# Altium footprint library xialeste-20221201.PcbLib: 195 footprints (part 6 of 13)
Each footprint in its own frame and in the unit in brackets; x right, y up, seen from the top. Pads: shape width x height; smd on the part's side, far side on the other; paste and mask are expansions set on the pad; w line width, h text height; cw(c..) or ccw(c..) is an arc to the next point about the centre after c.
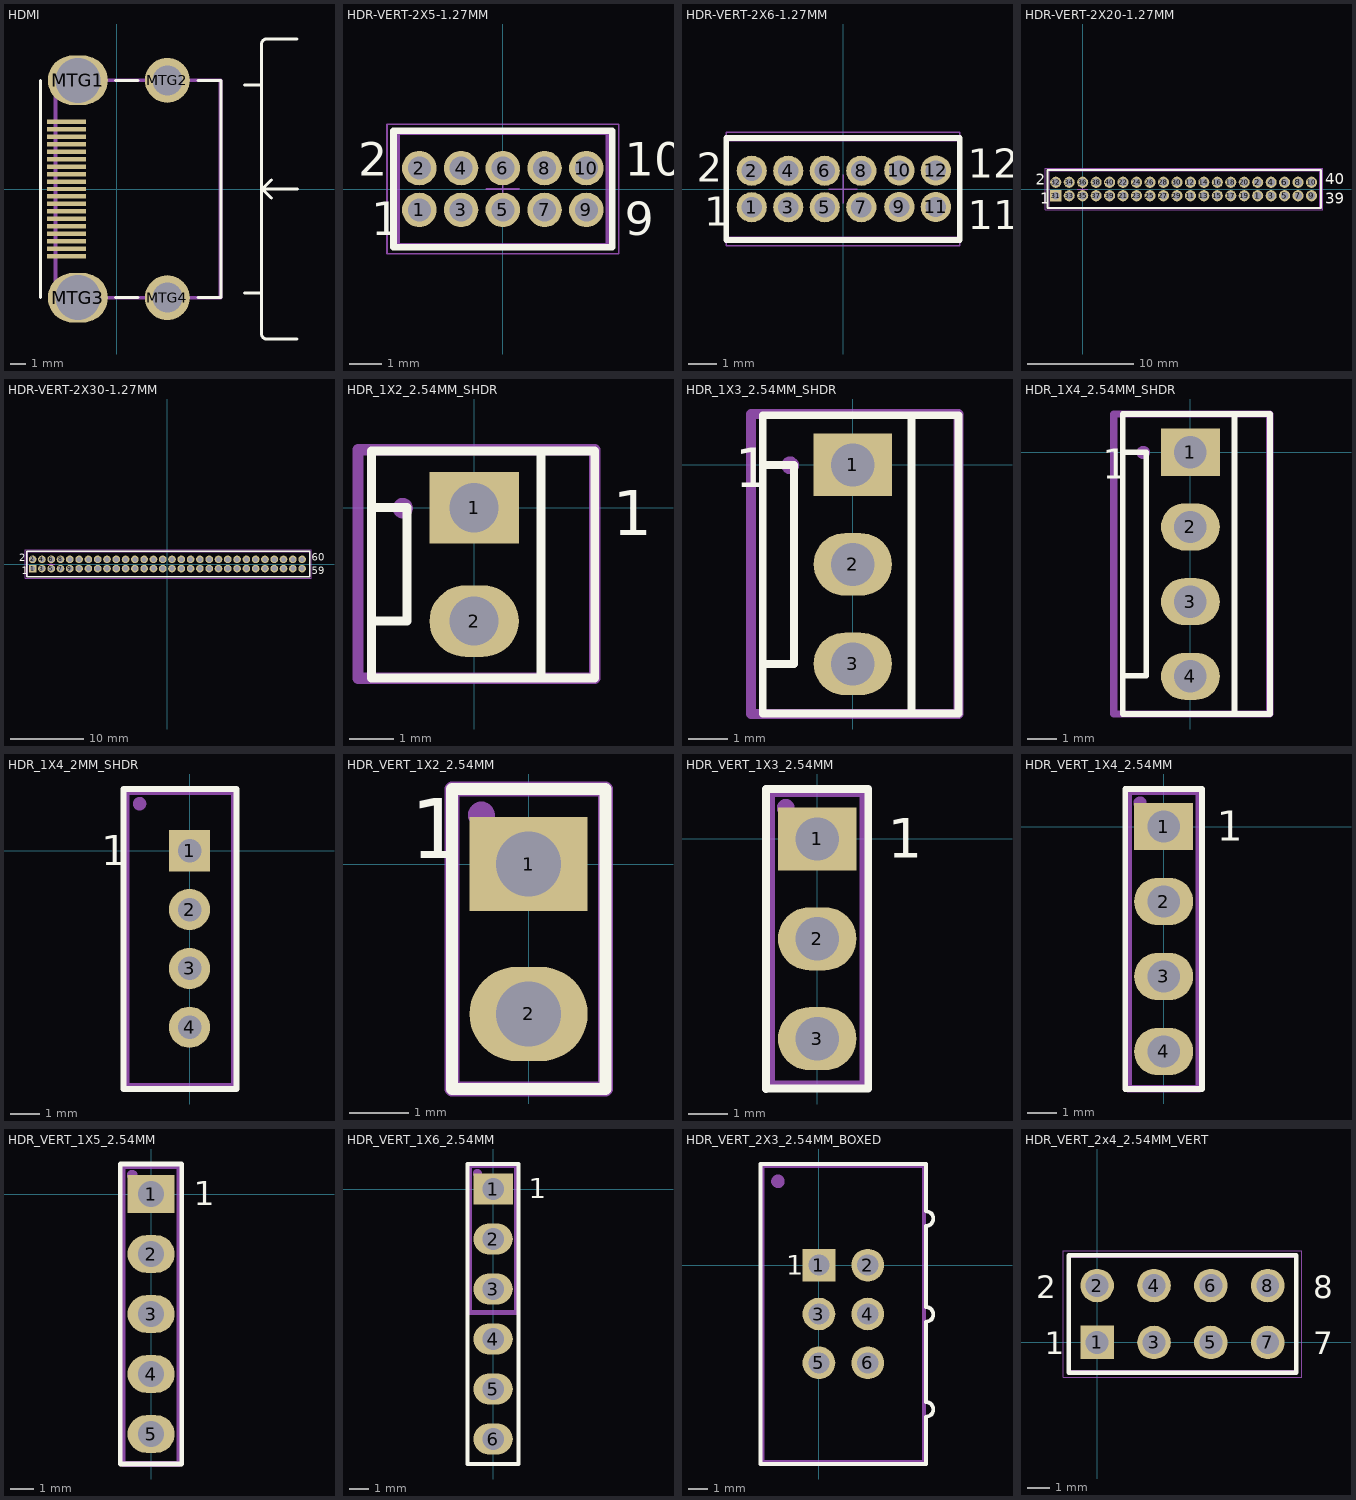
[diagram p5: the footprints below, top view; thin cyan lines are the x and y axes]

## HDMI [mm]
pads (23):
  rect 2.6x0.3 smd mask+0.025: 1(-3.36,4.5) 2(-3.36,4) 3(-3.36,3.5) 4(-3.36,3) 5(-3.36,2.5) 6(-3.36,2) 7(-3.36,1.5) 8(-3.36,1) 9(-3.36,0.5) 10(-3.36,0) 11(-3.36,-0.5) 12(-3.36,-1) 13(-3.36,-1.5) 14(-3.36,-2) 15(-3.36,-2.5) 16(-3.36,-3) 17(-3.36,-3.5) 18(-3.36,-4) 19(-3.36,-4.5)
  oval 4x3.3 hole 3: MTG1(-2.6,7.25) MTG3(-2.6,-7.25)
  round 3 hole 2: MTG2(3.36,7.25) MTG4(3.36,-7.25)
Top Overlay:
  lines w0.2: -5.1,-7.25 -5.1,7.25 ; -0.1,-7.25 1.4,-7.25 ; -0.1,7.25 1.4,7.25 ; 5.4,-7.25 6.9,-7.25 6.95,-7.2 6.95,7.25 ; 5.4,7.25 6.9,7.25 ; 8.5,-6.95 9.65,-6.95 ; 8.5,6.95 9.65,6.95 ; 9.95,10 12,10 ; 10,10 ccw(c9.975,9.675) 9.65,9.7 9.65,-9.7 ccw(c9.975,-9.675) 10,-10 12,-10 ; 10.3,-0.6 9.7,0 ; 10.3,0.6 9.7,0 ; 12.05,0 9.7,0
Mechanical 1:
  text "plastic may go over the board edge" at -6.6,9.6 h0.5
  text "doesnt fit on one place. Bottom" at -6.5,10.8 h0.5
  text "NOTE: Holes are big and connector" at -6.5,12 h0.5
Mechanical 29:
  lines w0.254: -4.1,-7.25 6.9,-7.25 6.9,7.25 -4.1,7.25 -4.1,-7.25
  text ".Designator" at 0.5,2.3 h1.52
3D body "HDMI connector.STEP": height 6.23, standoff -2.15, extent -4.53,-7.5 7.62,7.5

## HDR-VERT-2X5-1.27MM [mm] "Pin Header, pitch 1.27 mm, THT, Vertical, dual row, 10p"
height 5.65
pads (10):
  round 1.05 hole 0.7: 1(-2.54,-0.635) 2(-2.54,0.635) 3(-1.27,-0.635) 4(-1.27,0.635) 5(0,-0.635) 6(0,0.635) 7(1.27,-0.635) 8(1.27,0.635) 9(2.54,-0.635) 10(2.54,0.635)
Top Overlay:
  lines w0.2: -3.325,-1.775 -3.325,1.775 3.325,1.775 3.325,-1.775 -3.325,-1.775
  text "9" at 3.705,-1.4 h1.02
  text "10" at 3.705,0.4 h1.02
  text "1" at -4.005,-1.4 h1.02
  text "2" at -4.405,0.4 h1.02
Mechanical 13:
  lines w0.1: -3.175,-1.7 -3.175,1.7 3.175,1.7 3.175,-1.7 -3.175,-1.7
Mechanical 15:
  lines w0.05: -0.5,0 0.5,0 ; 0,-0.5 0,0.5 ; -3.525,-1.975 -3.525,1.975 3.525,1.975 3.525,-1.975 -3.525,-1.975
3D body "62201021121.stp": height 5.33, standoff -2.27, extent -3.175,-1.7 3.175,1.7

## HDR-VERT-2X6-1.27MM [mm] "Pin Header, pitch 1.27 mm, THT, Vertical, dual row, 12p"
height 5.65
pads (12):
  round 1.05 hole 0.7: 1(-3.175,-0.635) 2(-3.175,0.635) 3(-1.905,-0.635) 4(-1.905,0.635) 5(-0.635,-0.635) 6(-0.635,0.635) 7(0.635,-0.635) 8(0.635,0.635) 9(1.957,-0.622) 10(1.957,0.648) 11(3.227,-0.622) 12(3.227,0.648)
Top Overlay:
  lines w0.2: -4.064,-1.775 -4.064,1.775 4.064,1.775 4.064,-1.775 -4.064,-1.775
  text "11" at 4.34,-1.4 h1.02
  text "12" at 4.34,0.4 h1.02
  text "1" at -4.826,-1.27 h1.02
  text "2" at -5.08,0.254 h1.02
Mechanical 13:
  lines w0.1: -4.064,-1.7 -4.064,1.7 4.064,1.7 4.064,-1.7 -4.064,-1.7
Mechanical 15:
  lines w0.05: -0.5,0 0.5,0 ; 0,-0.5 0,0.5 ; -4.064,-1.975 -4.064,1.975 4.064,1.975 4.064,-1.975 -4.064,-1.975
3D body "Pin header 2x06 TH pitch 1.27mm.stp": height 6.09, standoff -1.51, extent -3.81,-1.7 3.81,1.7

## HDR-VERT-2X20-1.27MM [mm] "Pin Header, pitch 1.27 mm, THT, Vertical, dual row, 40p"
height 5.65
pads (40):
  round 1.05 hole 0.7: 1(16.51,-0.635) 2(16.51,0.635) 3(17.78,-0.635) 4(17.78,0.635) 5(19.05,-0.635) 6(19.05,0.635) 7(20.32,-0.635) 8(20.32,0.635) 9(21.59,-0.635) 10(21.59,0.635) 11(10.16,-0.635) 12(10.16,0.635) 13(11.43,-0.635) 14(11.43,0.635) 15(12.7,-0.635) 16(12.7,0.635) 17(13.97,-0.635) 18(13.97,0.635) 19(15.24,-0.635) 20(15.24,0.635) 21(3.81,-0.635) 22(3.81,0.635) 23(5.08,-0.635) 24(5.08,0.635) 25(6.35,-0.635) 26(6.35,0.635) 27(7.62,-0.635) 28(7.62,0.635) 29(8.89,-0.635) 30(8.89,0.635) 32(-2.54,0.635) 33(-1.27,-0.635) 34(-1.27,0.635) 35(0,-0.635) 36(0,0.635) 37(1.27,-0.635) 38(1.27,0.635) 39(2.54,-0.635) 40(2.54,0.635)
  rect 1.05x1.05 hole 0.7: 31(-2.54,-0.635)
Top Overlay:
  lines w0.2: -3.325,-1.775 -3.325,1.775 22.479,1.775 22.479,-1.775 -3.325,-1.775
  text "39" at 22.882,-1.375 h1.02
  text "40" at 22.882,0.425 h1.02
  text "1" at -4.005,-1.4 h1.02
  text "2" at -4.405,0.4 h1.02
Mechanical 13:
  lines w0.1: -3.175,-1.7 -3.175,1.7 22.352,1.7 22.352,-1.7 -3.175,-1.7
Mechanical 15:
  lines w0.05: -0.5,0 0.5,0 ; 0,-0.5 0,0.5 ; -3.525,-1.975 -3.525,1.975 22.657,1.975 22.657,-1.975 -3.525,-1.975

## HDR-VERT-2X30-1.27MM [mm] "Pin Header, pitch 1.27 mm, THT, Vertical, dual row, 60p"
height 5.65
pads (60):
  rect 1.05x1.05 hole 0.7: 1(-18.415,-0.635)
  round 1.05 hole 0.7: 2(-18.415,0.635) 3(-17.145,-0.635) 4(-17.145,0.635) 5(-15.875,-0.635) 6(-15.875,0.635) 7(-14.605,-0.635) 8(-14.605,0.635) 9(-13.335,-0.635) 10(-13.335,0.635) 11(-12.065,-0.635) 12(-12.065,0.635) 13(-10.795,-0.635) 14(-10.795,0.635) 15(-9.525,-0.635) 16(-9.525,0.635) 17(-8.255,-0.635) 18(-8.255,0.635) 19(-6.985,-0.635) 20(-6.985,0.635) 21(-5.715,-0.635) 22(-5.715,0.635) 23(-4.445,-0.635) 24(-4.445,0.635) 25(-3.175,-0.635) 26(-3.175,0.635) 27(-1.905,-0.635) 28(-1.905,0.635) 29(-0.635,-0.635) 30(-0.635,0.635) 31(0.635,-0.635) 32(0.635,0.635) 33(1.905,-0.635) 34(1.905,0.635) 35(3.175,-0.635) 36(3.175,0.635) 37(4.445,-0.635) 38(4.445,0.635) 39(5.715,-0.635) 40(5.715,0.635) 41(6.985,-0.635) 42(6.985,0.635) 43(8.255,-0.635) 44(8.255,0.635) 45(9.525,-0.635) 46(9.525,0.635) 47(10.795,-0.635) 48(10.795,0.635) 49(12.065,-0.635) 50(12.065,0.635) 51(13.335,-0.635) 52(13.335,0.635) 53(14.605,-0.635) 54(14.605,0.635) 55(15.875,-0.635) 56(15.875,0.635) 57(17.145,-0.635) 58(17.145,0.635) 59(18.415,-0.635) 60(18.415,0.635)
Top Overlay:
  lines w0.2: -19.2,-1.775 19.431,-1.775 19.431,1.775 -19.2,1.775 -19.2,-1.775
  text "2" at -20.28,0.4 h1.02
  text "1" at -19.88,-1.4 h1.02
  text "60" at 19.707,0.425 h1.02
  text "59" at 19.707,-1.375 h1.02
Mechanical 13:
  lines w0.1: -19.05,-1.7 19.431,-1.7 19.431,1.7 -19.05,1.7 -19.05,-1.7
Mechanical 15:
  lines w0.05: -16.375,0 -15.375,0 ; -15.875,-0.5 -15.875,0.5 ; -19.4,-1.975 19.685,-1.975 19.685,1.975 -19.4,1.975 -19.4,-1.975

## HDR_1X2_2.54MM_SHDR [mm] "Creator MM"
pads (2):
  rect 2x1.6 hole 1.1: 1(0,0)
  oval 2x1.6 hole 1.1: 2(0,-2.54)
Top Overlay:
  lines w0.2: -2.3,-2.54 -1.5,-2.54 -1.5,0 -2.3,0 ; 1.5,-3.8 1.5,1.27 ; -2.3,-3.81 2.7,-3.81 2.7,1.27 -2.3,1.27 -2.3,-3.81
  text "1" at 3.1,-0.62 h1.02
Mechanical 29:
  circle w0.254: c-1.6,-0.01 r0.1
  lines w0.254: -2.6,-3.82 2.7,-3.82 2.7,1.3 -2.6,1.3 -2.6,-3.82
  text ".Designator" at 0.5,-2.42 h1
3D body "76384-302LFc.stp": height 9.34, standoff -3.43, extent -2.6,-3.31 2.649,0.77

## HDR_1X3_2.54MM_SHDR [mm] "Creator MM, Another 3D model."
pads (3):
  rect 2x1.6 hole 1.1: 1(0,0)
  oval 2x1.6 hole 1.1: 2(0,-2.54) 3(0,-5.08)
Top Overlay:
  lines w0.2: -2.3,-5.08 -1.5,-5.08 -1.5,0 -2.3,0 ; 1.5,-6.35 1.5,1.27 ; -2.3,-6.35 2.7,-6.35 2.7,1.27 -2.3,1.27 -2.3,-6.35
  text "1" at -2.994,-0.57 h1.02
Mechanical 29:
  circle w0.254: c-1.6,-0.01 r0.1
  lines w0.254: -2.6,-6.36 -2.6,1.3 2.7,1.3 2.7,-6.36 -2.6,-6.36
  text ".Designator" at -0.6,-0.9 h1.52
3D body "76384-303LFc.stp": height 9.34, standoff -3.43, extent -2.6,-5.85 2.649,0.77

## HDR_1X4_2.54MM_SHDR [mm]
pads (4):
  rect 2x1.6 hole 1.1: 1(0,0)
  oval 2x1.6 hole 1.1: 2(0,-2.54) 3(0,-5.08) 4(0,-7.62)
Top Overlay:
  lines w0.2: -2.3,-7.6 -1.5,-7.6 -1.5,0 -2.3,0 ; 1.5,-8.9 1.5,1.3 ; -2.3,-8.9 -2.3,1.3 2.7,1.3 2.7,-8.9 -2.3,-8.9
  text "1" at -3,-0.9 h1.02
Mechanical 29:
  circle w0.254: c-1.6,-0.01 r0.1
  lines w0.254: -2.6,-8.9 2.7,-8.9 2.7,1.3 -2.6,1.3 -2.6,-8.9
  text ".Designator" at -1,-2.5 h1.52
3D body "76384-304lf.stp": height 9.34, standoff -3.43, extent -2.6,-8.39 2.649,0.77

## HDR_1X4_2MM_SHDR [mm] "Creator MM"
pads (4):
  rect 1.4x1.4 hole 0.8: 1(0,0)
  round 1.4 hole 0.8: 2(0,-2) 3(0,-4) 4(0,-6)
Top Overlay:
  lines w0.2: -2.25,-8.1 -2.25,2.1 1.6,2.1 1.6,-8.1 -2.25,-8.1
  text "1" at -3,-0.5 h1.02
Mechanical 29:
  circle w0.254: c-1.7,1.6 r0.1
  lines w0.2: -2.15,-8 1.5,-8 1.5,2 -2.15,2 -2.15,-8
  text ".Designator" at 0.5,-5.2 h1.52
3D body "532530470.stp": height 5.55, standoff -3.45, extent -2.15,-8 1.5,2

## HDR_VERT_1X2_2.54MM [mm]
pads (2):
  rect 2x1.6 hole 1.1: 1(0,0)
  oval 2x1.6 hole 1.1: 2(0,-2.54)
Top Overlay:
  lines w0.2: -1.3,-3.81 1.3,-3.81 1.3,1.27 -1.3,1.27 -1.3,-3.81
  text "1" at -2,0.1 h1.02
Mechanical 29:
  circle w0.254: c-0.8,0.83 r0.1
  lines w0.254: -1.3,-3.81 -1.3,1.27 1.3,1.27 1.3,-3.81 -1.3,-3.81
  text ".Designator" at 0.6,-2.7 h1
3D body "1x2 Male Pin Header.STEP": height 10.54, standoff -3, extent -1.194,-3.813 1.306,1.272

## HDR_VERT_1X3_2.54MM [mm] "Creator MM"
pads (3):
  rect 2x1.6 hole 1.1: 1(0,0)
  oval 2x1.6 hole 1.1: 2(0,-2.54) 3(0,-5.08)
Top Overlay:
  lines w0.2: -1.3,-6.36 -1.3,1.27 1.3,1.27 1.3,-6.3 ; -1.3,-6.35 1.3,-6.35
  text "1" at 1.8,-0.48 h1.02
Mechanical 29:
  circle w0.254: c-0.8,0.79 r0.1
  lines w0.254: -1.2,-6.27 -1.2,1.19 1.2,1.19 1.2,-6.27 -1.2,-6.27
  text ".Designator" at -0.7,-0.68 h1.52
3D body "1x3 Male Pin Header.STEP": height 10.54, standoff -3, extent -1.219,-6.378 1.281,1.247

## HDR_VERT_1X4_2.54MM [mm] "Creator MM"
pads (4):
  rect 2x1.6 hole 1.1: 1(0,0)
  oval 2x1.6 hole 1.1: 2(0,-2.54) 3(0,-5.08) 4(0,-7.62)
Top Overlay:
  lines w0.2: -1.3,-8.89 -1.3,1.27 1.3,1.27 1.3,-8.89 -1.3,-8.89
  text "1" at 1.8,-0.48 h1.02
Mechanical 29:
  circle w0.254: c-0.8,0.79 r0.1
  lines w0.254: -1.2,-8.89 1.2,-8.89 1.2,1.19 -1.2,1.19 -1.2,-8.89
  text ".Designator" at -0.7,-0.68 h1.52
3D body "1x4 Male Pin Header.STEP": height 10.54, standoff -3, extent -1.219,-8.918 1.281,1.247

## HDR_VERT_1X5_2.54MM [mm] "Creator MM"
pads (5):
  rect 2x1.6 hole 1.1: 1(0,0)
  oval 2x1.6 hole 1.1: 2(0,-2.54) 3(0,-5.08) 4(0,-7.62) 5(0,-10.16)
Top Overlay:
  lines w0.2: -1.3,-11.43 -1.3,1.27 1.3,1.27 1.3,-11.43 -1.3,-11.43
  text "1" at 1.8,-0.48 h1.02
Mechanical 29:
  circle w0.254: c-0.8,0.79 r0.1
  lines w0.254: -1.2,-11.43 1.2,-11.43 1.2,1.19 -1.2,1.19 -1.2,-11.43
  text ".Designator" at 2.54,1.27 h1.52
3D body "1x5 Male Pin Header.STEP": height 10.54, standoff -3, extent -1.219,-11.458 1.281,1.247

## HDR_VERT_1X6_2.54MM [mm] "Creator MM"
pads (6):
  rect 2x1.6 hole 1.1: 1(0,0)
  oval 2x1.6 hole 1.1: 2(0,-2.54) 3(0,-5.08) 4(0,-7.62) 5(0,-10.16) 6(0,-12.7)
Top Overlay:
  lines w0.2: -1.3,-13.97 1.3,-13.97 1.3,1.27 -1.3,1.27 -1.3,-13.97
  text "1" at 1.8,-0.48 h1.02
Mechanical 29:
  circle w0.254: c-0.8,0.79 r0.1
  lines w0.254: -1.2,-6.27 -1.2,1.19 1.2,1.19 1.2,-6.27 -1.2,-6.27
  text ".Designator" at -0.7,-0.68 h1.52
3D body "1x6 Male Pin Header.STEP": height 10.54, standoff -3, extent -1.219,-13.998 1.281,1.247

## HDR_VERT_2X3_2.54MM_BOXED [mm] "Creator MM"
height 9.3
pads (6):
  rect 1.7x1.7 hole 1.1: 1(0,0)
  round 1.7 hole 1.1: 2(2.54,0) 3(0,-2.54) 4(2.54,-2.54) 5(0,-5.08) 6(2.54,-5.08)
Top Overlay:
  lines w0.2: 5.57,-10.34 -3.03,-10.34 -3.03,5.26 5.57,5.26 5.57,2.8 cw(c5.57,2.42) 5.57,2.04 5.57,-2.18 cw(c5.57,-2.56) 5.57,-2.94 5.57,-7.12 cw(c5.57,-7.5) 5.57,-7.88 5.57,-10.3
  text "1" at -1.7,-0.5 h1.02
Mechanical 29:
  circle w0.5: c-2.13,4.36 r0.1
  lines w0.2: -2.93,-10.24 -2.93,5.16 5.47,5.16 5.47,-10.24 -2.93,-10.24
  text ".Designator" at 2,-4.5 h1.52
3D body "DS1013-6S (IDC-6MS CONNFLY).stp": height 9, standoff -3.6, extent -3.13,-10.25 5.67,5.17

## HDR_VERT_2x4_2.54MM_VERT [mm] "Socket Header, Pitch 2.54 mm, THT, Vertical, dual row, 8p"
height 8.4
pads (8):
  rect 1.5x1.5 hole 1.02: 1(0,0)
  round 1.5 hole 1.02: 2(0,2.54) 3(2.54,0) 4(2.54,2.54) 5(5.08,0) 6(5.08,2.54) 7(7.62,0) 8(7.62,2.54)
Top Overlay:
  lines w0.2: -1.27,-1.345 -1.27,3.885 8.89,3.885 8.89,-1.345 -1.27,-1.345
  text "1" at -2.33,-0.53 h1.02
  text "2" at -2.73,1.97 h1.02
  text "8" at 9.65,1.97 h1.02
  text "7" at 9.65,-0.53 h1.02
Mechanical 13:
  lines w0.1: -1.27,-1.27 -1.27,3.81 8.89,3.81 8.89,-1.27 -1.27,-1.27
Mechanical 15:
  lines w0.05: -1.524,-1.545 -1.524,4.085 9.144,4.085 9.144,-1.545 -1.524,-1.545
3D body "Pin Header 2x4 TH Pitch 2.54mm.stp": height 2.8, standoff -9.9, extent -1.27,-1.27 8.89,3.81